# Altium footprint library Cap.PcbLib: 31 footprints (part 2 of 2)
Each footprint in its own frame and in the unit in brackets; x right, y up, seen from the top. Pads: shape width x height; smd on the part's side, far side on the other; paste and mask are expansions set on the pad; w line width, h text height; cw(c..) or ccw(c..) is an arc to the next point about the centre after c.
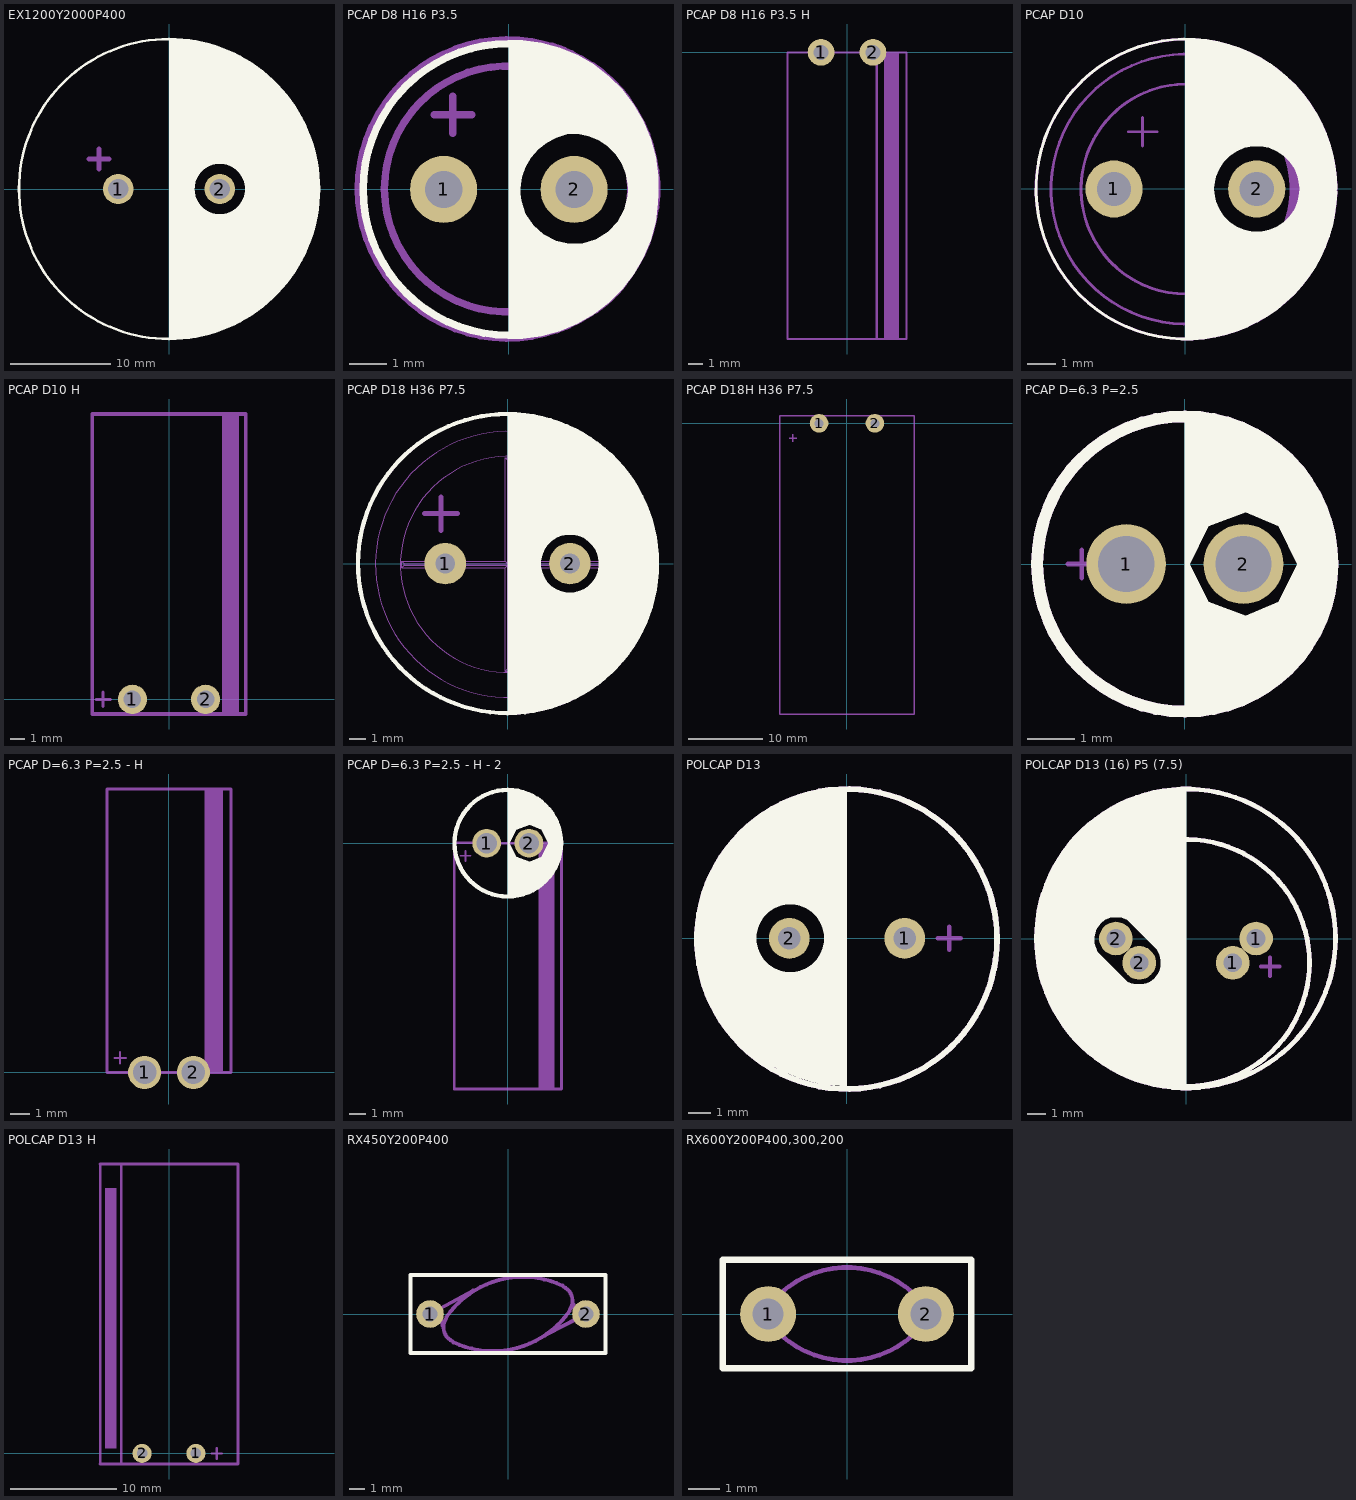
[diagram p1: the footprints below, top view; thin cyan lines are the x and y axes]

## EX1200Y2000P400 [mil]
pads (2):
  round 120 hole 80: 1(-200,0) 2(200,0)
Top Overlay:
  circle w10: c0,0 r590.55
  region: 0,0 108.27,0
  region: 100,0 100.48,9.8 104.31,29.03 111.81,47.14 122.7,63.44 136.56,77.3 152.86,88.19 170.97,95.69 190.2,99.52 200,100 209.8,99.52 229.03,95.69 247.14,88.19 263.44,77.3 277.3,63.44 288.19,47.14 295.69,29.03 299.52,9.8 300,0 590.55,0 590.55,23.2 586.91,69.47 579.65,115.3 568.82,160.42 554.48,204.56 536.72,247.43 515.65,288.78 491.4,328.35 464.13,365.89 433.99,401.18 401.18,433.99 365.89,464.13 328.35,491.4 288.78,515.65 247.43,536.72 204.56,554.48 160.42,568.82 115.3,579.65 69.47,586.91 23.2,590.55 0,590.55 0,0
  region: 100,0 100.48,-9.8 104.31,-29.03 111.81,-47.14 122.7,-63.44 136.56,-77.3 152.86,-88.19 170.97,-95.69 190.2,-99.52 200,-100 209.8,-99.52 229.03,-95.69 247.14,-88.19 263.44,-77.3 277.3,-63.44 288.19,-47.14 295.69,-29.03 299.52,-9.8 300,0 590.55,0 590.55,-23.2 586.91,-69.47 579.65,-115.3 568.82,-160.42 554.48,-204.56 536.72,-247.43 515.65,-288.78 491.4,-328.35 464.13,-365.89 433.99,-401.18 401.18,-433.99 365.89,-464.13 328.35,-491.4 288.78,-515.65 247.43,-536.72 204.56,-554.48 160.42,-568.82 115.3,-579.65 69.47,-586.91 23.2,-590.55 0,-590.55 0,0
Mechanical 13:
  lines w19.68: -314.96,118.11 -236.22,118.11 ; -275.59,78.74 -275.59,157.48
3D body "User Library-Assy_CE_R400_D1200_H2000.STEP": height 2019.68, standoff -251.45, extent -600.01,-599.98 599.99,600

## PCAP D8 H16 P3.5 [mm]
pads (2):
  round 1.8 hole 1 paste-25.4: 1(-1.75,0) 2(1.75,0)
Top Overlay:
  region: 0,4 0,-4 0.114,-4 0.369,-4 0.874,-3.934 1.366,-3.802 1.836,-3.607 2.277,-3.352 2.682,-3.042 3.042,-2.682 3.352,-2.277 3.607,-1.836 3.802,-1.366 3.934,-0.874 4,-0.369 4,-0.114 4,0 3.2,0 3.189,-0.186 3.098,-0.546 2.918,-0.87 2.661,-1.139 2.345,-1.334 1.99,-1.442 1.619,-1.456 1.257,-1.376 0.926,-1.207 0.65,-0.959 0.445,-0.65 0.325,-0.298 0.3,-0.114 0.301,0.033 0.345,0.324 0.443,0.601 0.591,0.854 0.784,1.076 1.015,1.257 1.276,1.392 1.557,1.476 1.703,1.497 1.85,1.49 2.138,1.433 2.409,1.32 2.653,1.157 2.86,0.95 3.023,0.706 3.136,0.435 3.193,0.147 3.2,0 4,0 4,0.114 4,0.369 3.934,0.874 3.802,1.366 3.607,1.836 3.352,2.277 3.042,2.682 2.682,3.042 2.277,3.352 1.836,3.607 1.366,3.802 0.874,3.934 0.369,4 0.114,4
  lines w0.2: 0,-3.912 cw(c0,0) -3.912,0 cw(c0,0) 0,3.912
Mechanical 13:
  region: 2.762,-1.737 2.877,-1.537 3.065,-1.116 3.192,-0.673 3.256,-0.217 3.256,0.244 3.192,0.7 3.065,1.143 2.877,1.564 2.762,1.763 3.561,1.763 3.66,1.559 3.811,1.132 3.913,0.69 3.964,0.24 3.964,-0.213 3.913,-0.664 3.811,-1.106 3.66,-1.533 3.561,-1.737
  lines w0.2: -2,2 -1,2 ; -1.5,1.5 -1.5,2.5 ; 1.157,3.831 1.16,3.84 cw(c-0.038,0.013) 1.297,3.794 1.294,3.785 ; 1.297,3.784 1.3,3.793 cw(c-0.038,0.013) 1.673,3.64 1.669,3.631 ; 2.225,3.312 2.23,3.32 cw(c-0.038,0.013) 2.341,3.241 ; 2.251,3.306 cw(c-0.038,0.013) 2.468,3.144 cw(c-0.038,0.013) 3.164,2.427 3.156,2.421 ; 2.322,-3.216 2.328,-3.224 ccw(c-0.038,0.013) 2.571,-3.032 ; 2.335,3.233 2.341,3.241 ; 2.349,-3.209 ccw(c-0.038,0.013) 2.657,-2.956 ; 2.564,-3.025 2.571,-3.032 ; 2.645,2.981 2.651,2.988 ; 2.675,-2.94 ccw(c-0.038,0.013) 3.006,-2.598 ; 2.76,-1.737 cw(c-0.038,0.013) 2.76,1.763 2.762,1.763 ; 2.766,-2.84 2.773,-2.847 ; 2.913,-2.687 2.921,-2.694 ; 3.004,2.611 3.011,2.617 ccw(c-0.038,0.013) 2.651,2.988 ; 3.08,-2.492 3.088,-2.499 cw(c-0.038,0.013) 2.921,-2.694 ; 3.559,-1.737 cw(c-0.038,0.013) 3.559,1.763 ; 2.341,3.241 cw(c-0.038,0.013) 2.651,2.988 ; 2.571,-3.032 ccw(c-0.038,0.013) 2.773,-2.847 ; 2.762,1.763 cw(c-0.036,0.013) 2.762,-1.737 3.561,-1.737 ccw(c-0.036,0.013) 3.561,1.763 2.762,1.763 ; 2.773,-2.847 ccw(c-0.038,0.013) 2.921,-2.694
3D body "User Library-Cap-EL(8x16-3_5).step": height 16, standoff -3.3, extent -4,-4 4.002,4

## PCAP D8 H16 P3.5 H [mm]
pads (2):
  round 1.8 hole 1 paste-25.4: 1(-1.75,0) 2(1.75,0)
Mechanical 13:
  region: 2.5,-19.302 2.5,0 3.5,0 3.5,-19.302
  lines w0.15: 2,-19.302 2,0 ; -4.001,-19.302 -4.001,0 4.001,0 4.001,-19.302 -4.001,-19.302
3D body "User Library-Cap-EL(8x16-3_5).step": height 11, standoff 3, extent -4.001,-19.302 4.001,0

## PCAP D10 [mm]
pads (2):
  round 2 hole 1.2 paste-25.4: 1(-2.5,0) 2(2.5,0)
Top Overlay:
  region: 0,5.25 0,-5.25 0.026,-5.25 0.369,-5.25 1.051,-5.16 1.715,-4.982 2.351,-4.719 2.946,-4.375 3.492,-3.957 3.978,-3.47 4.397,-2.925 4.74,-2.329 5.004,-1.694 5.181,-1.03 5.271,-0.348 5.271,-0.004 4,0 3.993,-0.147 3.935,-0.435 3.823,-0.707 3.66,-0.952 3.452,-1.16 3.207,-1.323 2.935,-1.435 2.647,-1.493 2.5,-1.5 2.353,-1.493 2.065,-1.435 1.793,-1.323 1.548,-1.16 1.34,-0.952 1.177,-0.707 1.065,-0.435 1.007,-0.147 1,0 1.007,0.147 1.065,0.435 1.177,0.707 1.34,0.952 1.548,1.16 1.793,1.323 2.065,1.435 2.353,1.493 2.5,1.5 2.647,1.493 2.935,1.435 3.207,1.323 3.452,1.16 3.66,0.952 3.823,0.707 3.935,0.435 3.993,0.147 4,0 5.271,-0.004 5.271,0.34 5.181,1.023 5.003,1.688 4.74,2.325 4.395,2.921 3.976,3.468 3.489,3.955 2.942,4.374 2.346,4.718 1.71,4.982 1.044,5.16 0.361,5.25 0.017,5.25
  lines w0.1: 5.27,-0.099 cw(c0.021,-0.004) 5.271,-0.004
Mechanical 13:
  region: 3.417,-1.411 4.387,-1.812 4.872,-2.013 4.97,-1.775 5.12,-1.281 5.221,-0.776 5.271,-0.262 5.271,0.254 5.221,0.767 5.12,1.273 4.97,1.767 4.872,2.005 4.387,1.804 3.417,1.402 3.481,1.234 3.586,0.889 3.656,0.535 3.692,0.176 3.692,-0.185 3.656,-0.544 3.586,-0.897 3.481,-1.242
  lines w0.1: -2,2 -1,2 ; -1.5,1.5 -1.5,2.5 ; 3.417,-1.411 cw(c0.021,-0.004) -3.654,-0.004 cw(c0.021,-0.004) 3.417,1.402 ; 3.417,-1.411 cw(c0.021,-0.004) 3.417,1.402 ; 3.417,-1.411 ccw(c0.021,-0.004) 3.417,1.402 ; 3.417,-1.411 4.387,-1.812 ; 3.417,1.402 4.387,1.804 ; 4.387,-1.812 cw(c0.021,-0.004) 4.387,1.804 ; 4.387,-1.812 ccw(c0.021,-0.004) 4.387,1.804 ; 4.387,-1.812 4.872,-2.013 ; 4.387,1.804 4.872,2.005 ; 4.872,-2.013 ccw(c0.021,-0.004) 4.872,2.005 ; 4.872,-2.013 cw(c0.021,-0.004) 4.872,2.005
3D body "User Library-CapAluRadial_D100H160.STEP": height 17.5, standoff -3, extent -5.25,-5.25 5.25,5.25

## PCAP D10 H [mm]
pads (2):
  round 2 hole 1.2 unplated paste-25.4: 1(-2.5,0) 2(2.5,0)
Mechanical 13:
  circle w0.254: c2.5,-0.03 r0.254
  circle w0.254: c-2.5,-0.03 r0.254
  region: 4.75,19.5 4.75,-1 3.75,-1 3.75,19.5
  lines w0.2: -5,0 -4,0 ; -4.5,-0.5 -4.5,0.5
  lines w0.254: 3.75,-1 3.75,19.5 ; -5.25,-1 5.25,-1 5.25,0.75 5.25,19.5 -5.25,19.5 -5.25,-1
3D body "User Library-CapAluRadial_D100H160.STEP": height 5.25, standoff -5.25, extent -5.25,-1 5.25,19.5

## PCAP D18 H36 P7.5 [mm]
pads (2):
  round 2.5 hole 1.2 unplated paste-25.4: 1(-3.75,0) 2(3.75,0)
Top Overlay:
  circle w0.254: c0,0 r9
  region: 0,9 0,-9 0.212,-9 0.643,-9 1.503,-8.915 2.35,-8.747 3.176,-8.496 3.974,-8.166 4.735,-7.759 5.453,-7.279 6.121,-6.731 6.731,-6.121 7.279,-5.453 7.759,-4.735 8.166,-3.974 8.496,-3.176 8.747,-2.35 8.915,-1.503 9,-0.643 9,-0.212 9,0 5.5,0 5.492,-0.172 5.425,-0.508 5.293,-0.825 5.103,-1.11 4.86,-1.353 4.575,-1.543 4.258,-1.675 3.922,-1.742 3.75,-1.75 3.578,-1.742 3.242,-1.675 2.925,-1.543 2.64,-1.353 2.397,-1.11 2.207,-0.825 2.075,-0.508 2.008,-0.172 2,0 2.008,0.172 2.075,0.508 2.207,0.825 2.397,1.11 2.64,1.353 2.925,1.543 3.242,1.675 3.578,1.742 3.75,1.75 3.922,1.742 4.258,1.675 4.575,1.543 4.86,1.353 5.103,1.11 5.293,0.825 5.425,0.508 5.492,0.172 5.5,0 9,0 9,0.034 9,0.474 8.914,1.351 8.742,2.215 8.486,3.058 8.149,3.872 7.734,4.649 7.244,5.381 6.685,6.062 6.062,6.685 5.381,7.244 4.649,7.734 3.872,8.149 3.058,8.486 2.215,8.742 1.351,8.914 0.474,9 0.034,9
Mechanical 13:
  lines w0.05: 7.667,-2.495 cw(c0.05,-0.05) 7.704,2.279 ; 8.711,-2.495 cw(c0.05,-0.05) 8.743,2.279 ; -6.382,-0.25 -0.15,-0.25 ; -6.382,-0.25 -6.382,0.15 ; -6.382,-0.25 -6.232,-0.1 ; -6.382,0.15 -0.15,0.15 ; -6.382,0.15 -6.232,0 ; -6.232,-0.1 0,-0.1 ; -6.232,-0.1 -6.232,0 ; -6.232,0 0,0 ; -0.15,-6.482 0,-6.332 ; -0.15,-6.482 0.25,-6.482 ; -0.15,-6.482 -0.15,-0.25 ; -0.15,-0.25 0,-0.1 ; -0.15,0.15 -0.15,6.382 ; -0.15,0.15 0,0 ; -0.15,6.382 0.25,6.382 ; -0.15,6.382 0,6.232 ; 0,-6.332 0.1,-6.332 ; 0,-6.332 0,-0.1 ; 0,0 0,6.232 ; 0,6.232 0.1,6.232 ; 0.1,-6.332 0.1,-0.1 ; 0.1,-6.332 0.25,-6.482 ; 0.1,-0.1 0.25,-0.25 ; 0.1,-0.1 6.332,-0.1 ; 0.1,0 6.332,0 ; 0.1,0 0.25,0.15 ; 0.1,0 0.1,6.232 ; 0.1,6.232 0.25,6.382 ; 0.25,-6.482 0.25,-0.25 ; 0.25,-0.25 6.482,-0.25 ; 0.25,0.15 0.25,6.382 ; 0.25,0.15 6.482,0.15 ; 6.072,-2.495 cw(c0.05,-0.05) 6.118,2.279 ; 6.072,-2.495 ccw(c0.05,-0.05) 6.118,2.279 ; 6.072,-2.495 7.669,-2.495 ; 6.118,2.279 7.706,2.279 ; 6.332,-0.1 6.332,0 ; 6.332,-0.1 6.482,-0.25 ; 6.332,0 6.482,0.15 ; 6.482,-0.25 6.482,0.15 ; 7.669,-2.495 ccw(c0.052,-0.05) 7.706,2.279 ; 7.669,-2.495 8.713,-2.495 ccw(c0.052,-0.05) 8.745,2.279 7.706,2.279
  lines w0.3: -5,3 -3,3 ; -4,2 -4,4
3D body "User Library-Cap-EL(18x36-7_5)T.step": height 37, standoff -3, extent -9,-9 9.002,9

## PCAP D18H H36 P7.5 [mm]
pads (2):
  round 2.5 hole 1.2 unplated paste-25.4: 1(-3.75,0) 2(3.75,0)
Mechanical 13:
  lines w0.2: -7.75,-2 -6.75,-2 ; -7.25,-2.5 -7.25,-1.5 ; -9,-39.002 9.002,-39.002 9.002,1 -9,1 -9,-39.002
3D body "User Library-Cap-EL(18x36-7_5)T.step": height 19, standoff 1, extent -9,-39.002 9.002,1

## PCAP D=6.3 P=2.5 [mm]
pads (2):
  round 1.7 hole 1.2: 1(-1.25,0) 2(1.25,0)
Top Overlay:
  circle w0.254: c0,0 r3.15
  region: 0,0 0,-3.2 1.3,-2.9 2.2,-2.3 2.9,-1.3 3.2,0 2.4,0 2,-0.8 1.3,-1.1 0.5,-0.8 0.1,0
  region: 0.1,0 0.5,0.8 1.3,1.1 2,0.8 2.4,0 3.2,0 2.9,1.3 2.2,2.3 1.3,2.9 0,3.2 0,0
Mechanical 3:
  text ".Designator / .Comment" at -2.159,1.238 h1.02
Mechanical 13:
  circle w0.254: c0,0 r3.15
  circle w0.254: c-1.25,0 r0.254
  circle w0.254: c1.25,0 r0.254
  lines w0.1: -2.5,0 -1.9,0 ; -2.2,-0.3 -2.2,0.3
3D body "User Library-Cap electro 6_3x11x2_5mm.step": height 11.53, standoff -3.01, extent -3.175,-3.175 3.176,3.176

## PCAP D=6.3 P=2.5 - H [mm]
pads (2):
  round 1.7 hole 1.2: 1(-1.25,0) 2(1.25,0)
Mechanical 3:
  text ".Designator / .Comment" at -2.159,1.238 h1.02
Mechanical 13:
  circle w0.254: c1.25,0 r0.254
  circle w0.254: c-1.25,0 r0.254
  region: 1.824,14.507 2.75,14.507 2.75,-0.007 1.824,-0.007
  lines w0.1: -2.8,0.75 -2.2,0.75 ; -2.5,0.45 -2.5,1.05
  lines w0.15: -1.5,-0.014 -3.175,-0.014 -3.175,14.526 3.176,14.526 3.176,-0.014 1.504,-0.014 ; -0.996,0 1,0 ; 2.25,-0.014 2.25,14.526 2.5,14.526
3D body "User Library-Cap electro 6_3x11x2_5mm.step": height 7.38, standoff 1.02, extent -3.175,-0.014 3.176,14.526

## PCAP D=6.3 P=2.5 - H - 2 [mm]
pads (2):
  round 1.7 hole 1.2: 1(-1.25,0) 2(1.25,0)
Top Overlay:
  circle w0.254: c0,0 r3.15
  region: 0.1,0 0.5,0.8 1.3,1.1 2,0.8 2.4,0 3.2,0 2.9,1.3 2.2,2.3 1.3,2.9 0,3.2 0,0
  region: 0,0 0,-3.2 1.3,-2.9 2.2,-2.3 2.9,-1.3 3.2,0 2.4,0 2,-0.8 1.3,-1.1 0.5,-0.8 0.1,0
Mechanical 3:
  text ".Designator / .Comment" at -2.159,1.238 h1.02
Mechanical 13:
  circle w0.254: c-1.252,0 r0.254
  circle w0.254: c1.248,0 r0.254
  region: 1.822,-14.507 2.748,-14.507 2.748,0.007 1.822,0.007
  lines w0.1: -2.802,-0.75 -2.202,-0.75 ; -2.502,-1.05 -2.502,-0.45
  lines w0.15: -1.502,0.014 -3.177,0.014 -3.177,-14.526 3.174,-14.526 3.174,0.014 1.502,0.014 ; -0.998,0 0.998,0 ; 2.248,0.014 2.248,-14.526 2.498,-14.526
3D body "User Library-Cap electro 6_3x11x2_5mm.step": height 7.38, standoff 1.02, extent -3.177,-14.526 3.173,0.014

## POLCAP D13 [mm]
pads (2):
  round 1.8 hole 1: 1(2.54,0) 2(-2.54,0)
Top Overlay:
  circle w0.254: c0,-0.03 r6.604
  region: 0,-6.5 0,0 -1,0 -1.007,-0.147 -1.065,-0.435 -1.177,-0.707 -1.34,-0.952 -1.548,-1.16 -1.793,-1.323 -2.065,-1.435 -2.353,-1.493 -2.5,-1.5 -2.647,-1.493 -2.935,-1.435 -3.207,-1.323 -3.452,-1.16 -3.66,-0.952 -3.823,-0.707 -3.935,-0.435 -3.993,-0.147 -4,0 -3.993,0.147 -3.935,0.435 -3.823,0.707 -3.66,0.952 -3.452,1.16 -3.207,1.323 -2.935,1.435 -2.647,1.493 -2.5,1.5 -2.353,1.493 -2.065,1.435 -1.793,1.323 -1.548,1.16 -1.34,0.952 -1.177,0.707 -1.065,0.435 -1.007,0.147 -1,0 0,0 0,6.5 -0.319,6.5 -0.955,6.437 -1.581,6.313 -2.192,6.127 -2.782,5.883 -3.346,5.582 -3.877,5.227 -4.37,4.822 -4.822,4.37 -5.227,3.877 -5.582,3.346 -5.883,2.782 -6.127,2.192 -6.313,1.581 -6.437,0.955 -6.5,0.319 -6.5,0 -6.5,-0.319 -6.437,-0.955 -6.313,-1.581 -6.127,-2.192 -5.883,-2.782 -5.582,-3.346 -5.227,-3.877 -4.822,-4.37 -4.37,-4.822 -3.877,-5.227 -3.346,-5.582 -2.782,-5.883 -2.192,-6.127 -1.581,-6.313 -0.955,-6.437 -0.319,-6.5
Mechanical 3:
  text ".Designator / .Comment" at -2.159,1.778 h1.02
Mechanical 13:
  circle w0.254: c0,-0.03 r6.604
  circle w0.254: c-2.5,-0.03 r0.254
  circle w0.254: c2.5,-0.03 r0.254
  lines w0.2: 4,0 5,0 ; 4.5,-0.5 4.5,0.5
3D body "User Library-Cap-EL(13x25-5).step": height 25.1, standoff -3.2, extent -6.502,-6.499 6.5,6.499

## POLCAP D13 (16) P5 (7.5) [mm]
pads (4):
  round 1.8 hole 1: 1(2.5,-1.3) 1(3.75,0) 2(-3.75,0) 2(-2.5,-1.3)
Top Overlay:
  circle w0.254: c0,-1.3 r6.604
  circle w0.25: c0,0 r8
  region: 0,-0.6 -1.55,-0.6 -1.4,-0.9 -1.35,-1.15 -1.35,-1.5 -1.4,-1.7 -1.5,-1.9 -1.7,-2.15 -1.9,-2.3 -2.1,-2.4 -2.4,-2.45 -2.65,-2.45 -2.95,-2.4 -3.15,-2.3 -3.35,-2.1 -7.7,-2.1 -7.55,-2.7 -7.05,-3.85 -6.35,-4.85 -5.35,-5.95 -4.25,-6.8 -2.7,-7.55 -1.35,-7.9 0,-8.05
  region: -1.75,7.85 -3.2,7.35 -5.1,6.2 -6.25,5 -7.25,3.45 -7.75,2 -7.95,0.75 -8,-0.4 -7.85,-1.55 -7.65,-2.3 -3.15,-2.3 -4.75,-0.7 -4.9,-0.25 -4.9,0.1 -4.8,0.5 -4.6,0.8 -4.35,1 -4,1.15 -3.5,1.15 -3.15,1 -1.25,-0.9 0,-0.9 0,8
Mechanical 3:
  text ".Designator / .Comment" at -2.159,-0.762 h1.02
Mechanical 13:
  circle w0.254: c2.5,-1.3 r0.254
  circle w0.254: c-3.75,0 r0.254
  circle w0.254: c3.75,0 r0.254
  circle w0.254: c-2.5,-1.3 r0.254
  circle w0.25: c0,0 r8
  circle w0.254: c0,-1.3 r6.604
  lines w0.2: 4,-1.5 5,-1.5 ; 4.5,-2 4.5,-1
3D body "User Library-Cap-EL(16x26-7_5).step": height 27, standoff -3.3, extent -8.002,-7.997 8,7.997

## POLCAP D13 H [mm]
pads (2):
  round 1.8 hole 1: 1(2.54,0) 2(-2.54,0)
Mechanical 3:
  text ".Designator / .Comment" at -2.159,1.778 h1.02
Mechanical 13:
  circle w0.254: c-2.5,-0.03 r0.254
  circle w0.254: c2.5,-0.03 r0.254
  region: -6,25 -6,0.5 -5,0.5 -5,25
  lines w0.2: 4,0 5,0 ; 4.5,-0.5 4.5,0.5
  lines w0.254: -6.501,-1 6.501,-1 6.501,27.302 -6.501,27.302 ; -6.5,-0.999 -6.5,-0.5 -6.5,27.301 ; -4.5,-1 -4.5,27.302
3D body "User Library-Cap-EL(13x25-5).step": height 15.7, standoff 2.7, extent -6.501,-1 6.501,27.302

## RX450Y200P400 [mm]
pads (2):
  round 1.8 hole 1: 1(-5.08,0) 2(5.08,0)
Top Overlay:
  lines w0.254: -6.35,-2.54 -6.35,2.54 6.35,2.54 6.35,-2.54 -6.35,-2.54
Mechanical 3:
  text ".Designator / .Comment" at -1.905,-0.635 h1.02
Mechanical 13:
  circle w0.254: c-5.08,0 r0.254
  circle w0.254: c5.08,0 r0.254
  lines w0.254: -5.08,-0.254 cw(c-4.826,-0.762) -4.258,-0.762 ; -5.08,0 -2.286,1.524 ; -4.022,-0.272 ccw(c-3.189,-0.855) -3.619,-1.775 ; -4.007,-0.184 cw(c0.986,-3.68) 3.562,1.845 ; -3.562,-1.845 ccw(c-0.986,3.68) 4.007,0.184 ; 2.413,-1.397 5.08,0 ; 3.619,1.775 cw(c3.189,0.855) 4.022,0.272 ; 4.258,0.635 ccw(c4.826,0.635) 5.167,0.181
3D body "User Library-capacitor 10mm pitch.SLDPRT": height 12.5, standoff -4, extent -5.5,-2.5 5.5,2.5

## RX600Y200P400,300,200 [mm]
pads (2):
  round 1.8 hole 1: 1(-2.54,0) 2(2.54,0)
Top Overlay:
  lines w0.203: -4,-1.75 -4,1.75 4,1.75 4,-1.75 -4,-1.75
Mechanical 3:
  text ".Designator / .Comment" at -2.159,-0.762 h1.02
Mechanical 13:
  lines w0.15: -2.693,0 cw(c0,-1.667) 2.693,0 cw(c0,1.667) -2.693,0
3D body "User Library-Cer-Cap2_5 (5x1_5).step": height 7, standoff -1, extent -2.739,-1.233 2.739,1.034